# Altium footprint library agh_racing_2018.PcbLib: 174 footprints (part 10 of 11)
Each footprint in its own frame and in the unit in brackets; x right, y up, seen from the top. Pads: shape width x height; smd on the part's side, far side on the other; paste and mask are expansions set on the pad; w line width, h text height; cw(c..) or ccw(c..) is an arc to the next point about the centre after c.
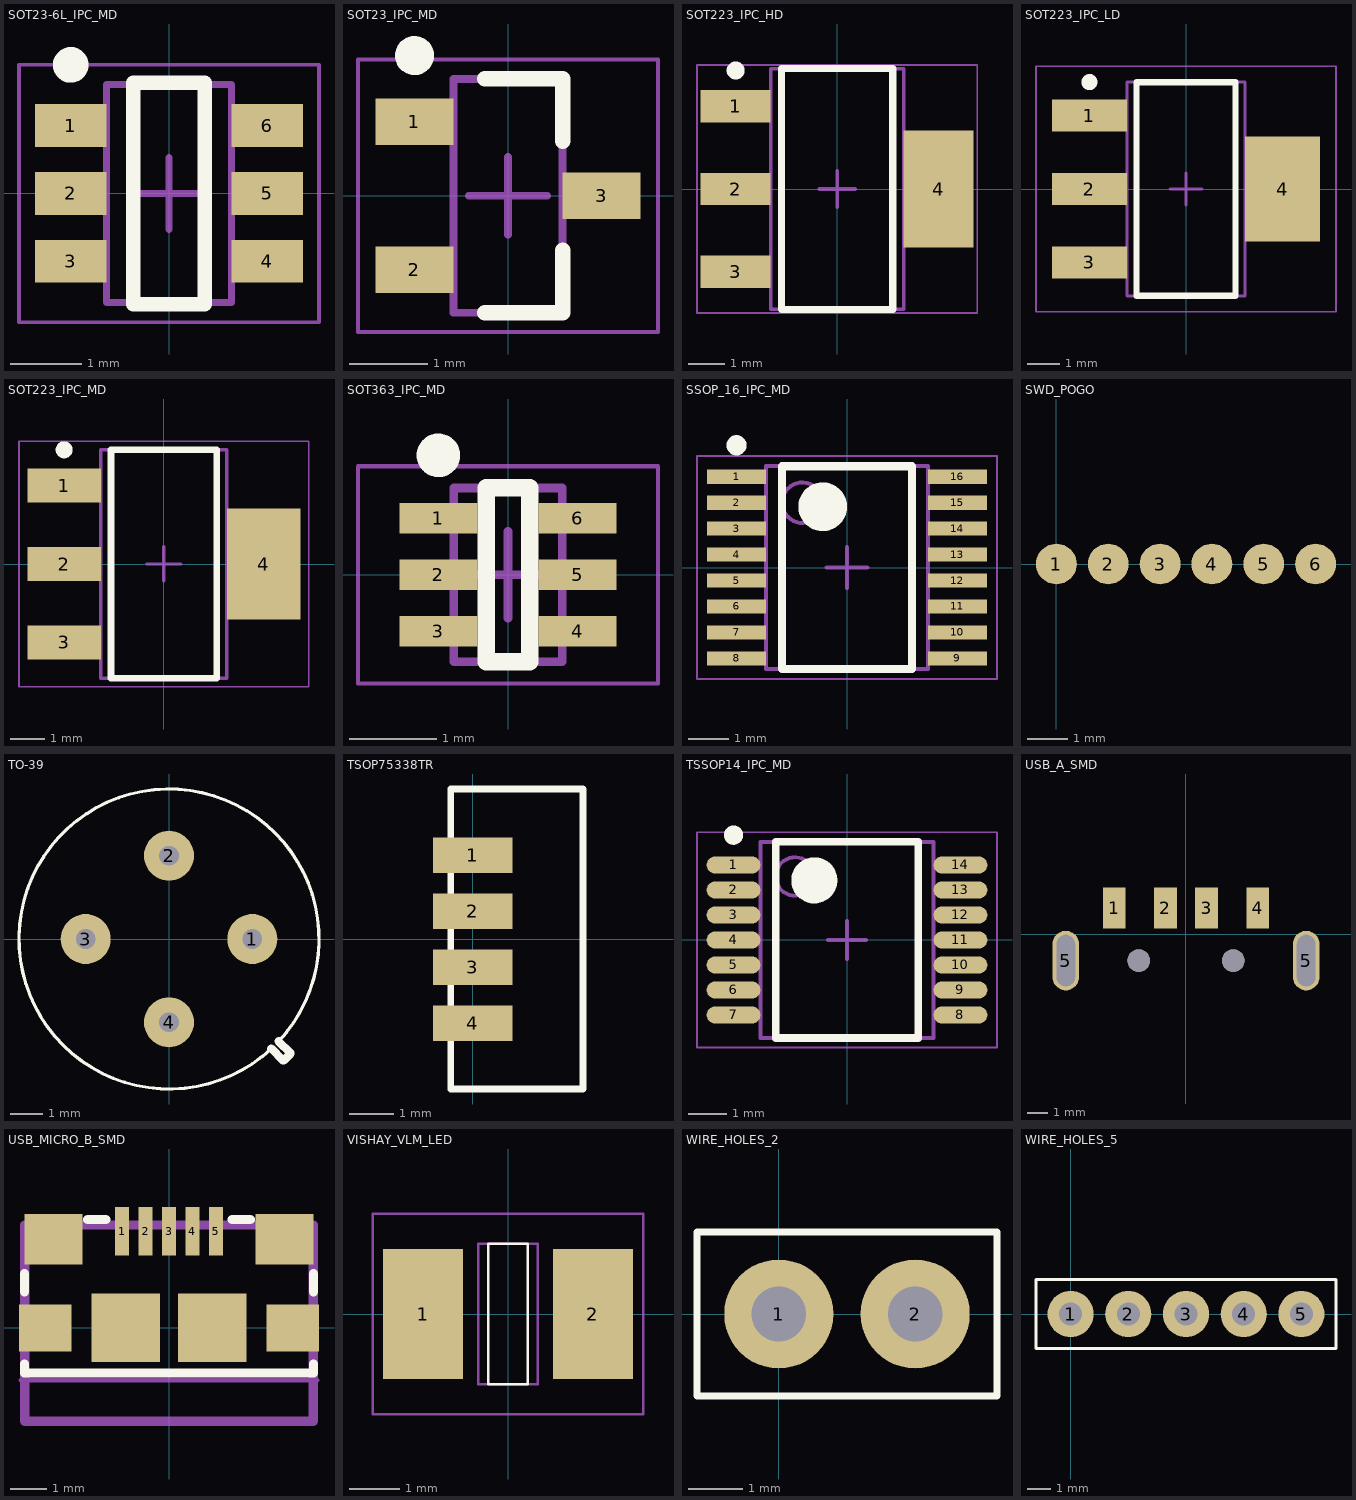
[diagram p9: the footprints below, top view; thin cyan lines are the x and y axes]

## SOT23-6L_IPC_MD [mm]
height 1.45
pads (6):
  rect 1x0.6 smd: 1(-1.375,0.95) 2(-1.375,0) 3(-1.375,-0.95) 4(1.375,-0.95) 5(1.375,0) 6(1.375,0.95)
Top Overlay:
  circle w0.25: c-1.375,1.8 r0.125
  lines w0.2: -0.5,-1.55 0.5,-1.55 0.5,1.55 -0.5,1.55 -0.5,-1.55
Assembly Top:
  lines w0.1: -0.875,-1.525 -0.875,1.525 0.875,1.525 0.875,-1.525 -0.875,-1.525
Courtyard Top:
  lines w0.05: -2.1,-1.8 -2.1,1.8 2.1,1.8 2.1,-1.8 -2.1,-1.8
  lines w0.1: -0.5,0 0.5,0 ; 0,-0.5 0,0.5
3D body "SOT23127P600-8N.step": height 1.45, standoff 0, extent -1.5,-1.525 1.5,1.525

## SOT23_IPC_MD [mm] "SOT23, 3-Leads, Body 2.90x2.45mm, Pitch 0.95mm, IPC Medium Density"
height 1.1
pads (3):
  rect 1x0.6 smd: 1(-1.2,0.95) 2(-1.2,-0.95) 3(1.2,0)
Top Overlay:
  circle w0.25: c-1.2,1.8 r0.125
  lines w0.2: -0.3,-1.5 0.7,-1.5 0.7,-0.7 ; -0.3,1.5 0.7,1.5 0.7,0.7
Mechanical 13:
  lines w0.1: -0.7,-1.5 0.7,-1.5 0.7,1.5 -0.7,1.5 -0.7,-1.5
Mechanical 15:
  lines w0.05: -1.925,-1.75 1.925,-1.75 1.925,1.75 -1.925,1.75 -1.925,-1.75
  lines w0.1: -0.5,0 0.5,0 ; 0,-0.5 0,0.5
3D body "SOT23_IPC_MD.step": height 1.1, standoff 0, extent -1.3,-1.5 1.3,1.5

## SOT223_IPC_HD [mm] "SOT223, 4-Leads, Body 6.50x7.00mm (avg), Pitch 2.30mm, IPC High Density"
height 1.8
pads (4):
  rect 1.95x0.9 smd: 1(-2.825,2.3) 2(-2.825,0) 3(-2.825,-2.3)
  rect 1.95x3.25 smd: 4(2.825,0)
Top Overlay:
  circle w0.25: c-2.825,3.3 r0.125
  lines w0.2: -1.55,-3.35 -1.55,3.35 1.55,3.35 1.55,-3.35 -1.55,-3.35
Mechanical 13:
  lines w0.1: -1.85,-3.35 -1.85,3.35 1.85,3.35 1.85,-3.35 -1.85,-3.35
Mechanical 15:
  lines w0.05: -3.9,-3.45 -3.9,3.45 3.9,3.45 3.9,-3.45 -3.9,-3.45
  lines w0.1: -0.5,0 0.5,0 ; 0,-0.5 0,0.5
3D body "SOT223_IPC_HD.step": height 1.8, standoff 0, extent -3.5,-3.35 3.5,3.35

## SOT223_IPC_LD [mm] "SOT223, 4-Leads, Body 6.50x7.00mm (avg), Pitch 2.30mm, IPC Low Density"
height 1.8
pads (4):
  rect 2.35x1 smd: 1(-3.025,2.3) 2(-3.025,0) 3(-3.025,-2.3)
  rect 2.35x3.3 smd: 4(3.025,0)
Top Overlay:
  circle w0.25: c-3.025,3.35 r0.125
  lines w0.2: -1.55,-3.35 -1.55,3.35 1.55,3.35 1.55,-3.35 -1.55,-3.35
Mechanical 13:
  lines w0.1: -1.85,-3.35 -1.85,3.35 1.85,3.35 1.85,-3.35 -1.85,-3.35
Mechanical 15:
  lines w0.05: -4.7,-3.85 -4.7,3.85 4.7,3.85 4.7,-3.85 -4.7,-3.85
  lines w0.1: -0.5,0 0.5,0 ; 0,-0.5 0,0.5
3D body "SOT223_IPC_LD.step": height 1.8, standoff 0, extent -3.5,-3.35 3.5,3.35

## SOT223_IPC_MD [mm] "SOT223, 4-Leads, Body 6.50x7.00mm (avg), Pitch 2.30mm, IPC Medium Density"
height 1.8
pads (4):
  rect 2.15x1 smd: 1(-2.925,2.3) 2(-2.925,0) 3(-2.925,-2.3)
  rect 2.15x3.25 smd: 4(2.925,0)
Top Overlay:
  circle w0.25: c-2.925,3.35 r0.125
  lines w0.2: -1.55,-3.35 -1.55,3.35 1.55,3.35 1.55,-3.35 -1.55,-3.35
Mechanical 13:
  lines w0.1: -1.85,-3.35 -1.85,3.35 1.85,3.35 1.85,-3.35 -1.85,-3.35
Mechanical 15:
  lines w0.05: -4.25,-3.6 -4.25,3.6 4.25,3.6 4.25,-3.6 -4.25,-3.6
  lines w0.1: -0.5,0 0.5,0 ; 0,-0.5 0,0.5
3D body "SOT223_IPC_MD.step": height 1.8, standoff 0, extent -3.5,-3.35 3.5,3.35

## SOT363_IPC_MD [mm] "SOT363, 6-Leads, Body, Pitch 0,65mm, IPC Medium Density"
height 0.9
pads (6):
  rect 0.9x0.35 smd: 1(-0.8,0.65) 2(-0.8,0) 3(-0.8,-0.65) 4(0.8,-0.65) 5(0.8,0) 6(0.8,0.65)
Top Overlay:
  circle w0.25: c-0.8,1.375 r0.125
  lines w0.2: -0.25,-1 -0.25,1 0.25,1 0.25,-1 -0.25,-1
Assembly Top:
  lines w0.1: -0.625,-1 0.625,-1 0.625,1 -0.625,1 -0.625,-1
Courtyard Top:
  lines w0.05: -1.725,-1.25 1.725,-1.25 1.725,1.25 -1.725,1.25 -1.725,-1.25
  lines w0.1: -0.5,0 0.5,0 ; 0,-0.5 0,0.5
3D body "SOT363_MD.step": height 0.9, standoff 0, extent -1.2,-1 1.2,1

## SSOP_16_IPC_MD [mm] "SSOP, 16-Leads, Pitch 0,64mm, IPC Medium Density"
height 1.75
pads (16):
  rect 1.45x0.35 smd mask+0.145: 1(-2.725,2.24) 2(-2.725,1.6) 3(-2.725,0.96) 4(-2.725,0.32) 5(-2.725,-0.32) 6(-2.725,-0.96) 7(-2.725,-1.6) 8(-2.725,-2.24) 9(2.725,-2.24) 10(2.725,-1.6) 11(2.725,-0.96) 12(2.725,-0.32) 13(2.725,0.32) 14(2.725,0.96) 15(2.725,1.6) 16(2.725,2.24)
Top Overlay:
  circle w0.25: c-2.725,3.015 r0.125
  circle w0.6: c-0.6,1.5 r0.3
  lines w0.2: -1.6,-2.5 -1.6,2.5 1.6,2.5 1.6,-2.5 -1.6,-2.5
Mechanical 13:
  circle w0.1: c-1.1,1.6 r0.5
  lines w0.1: -2,-2.5 -2,2.5 2,2.5 2,-2.5 -2,-2.5
Mechanical 15:
  lines w0.05: -3.7,-2.75 -3.7,2.75 3.7,2.75 3.7,-2.75 -3.7,-2.75
  lines w0.1: -0.5,0 0.5,0 ; 0,-0.5 0,0.5
3D body "SSOP16.step": height 1.75, standoff 0, extent -2.997,-2.5 2.997,2.5

## SWD_POGO [mm]
pads (6):
  round 1 smd mask+0.145: 1(0,0) 2(1.27,0) 3(2.54,0) 4(3.81,0) 5(5.08,0) 6(6.35,0)

## TO-39 [mil]
height 216.93
pads (4):
  round 60 hole 23.62: 1(100,0) 2(0,100) 3(-100,0) 4(0,-100)
Top Overlay:
  lines w3.94: 122.84,-131.73 cw(c0,0) 131.73,-122.84
  lines w10: 122.84,-131.73 136.78,-145.67 ; 131.73,-122.84 145.67,-136.78 145.67,-137.8 137.8,-145.67 ; 136.78,-145.67 137.8,-145.67 ; 136.78,-145.67 137.8,-145.67
3D body "EL-18009-AA Sensor.STEP": height 190.94, standoff -118.11, extent -183.07,-183.07 183.08,183.08

## TSOP75338TR [mm]
pads (4):
  rect 1.8x0.8 smd: 1(0,1.905) 2(0,0.635) 3(0,-0.635) 4(0,-1.905)
Top Overlay:
  lines w0.152: -0.5,-3.395 -0.5,3.405 2.5,3.405 2.5,-3.395 -0.5,-3.395
3D body "TSOP753.STEP": height 3, standoff 0, extent -0.507,-3.5 2.6,3.3

## TSSOP14_IPC_MD [mm] "TSSOP, 14-Leads, Body 5,00x4,40mm, Pitch 0,65mm, IPC Medium Density"
height 1.2
pads (14):
  oval 1.4x0.45 smd: 1(-2.95,1.95) 2(-2.95,1.3) 3(-2.95,0.65) 4(-2.95,0) 5(-2.95,-0.65) 6(-2.95,-1.3) 7(-2.95,-1.95) 8(2.95,-1.95) 9(2.95,-1.3) 10(2.95,-0.65) 11(2.95,0) 12(2.95,0.65) 13(2.95,1.3) 14(2.95,1.95)
Top Overlay:
  circle w0.6: c-0.85,1.55 r0.3
  circle w0.25: c-2.95,2.725 r0.125
  lines w0.2: -1.85,-2.55 1.85,-2.55 1.85,2.55 -1.85,2.55 -1.85,-2.55
Mechanical 13:
  circle w0.1: c-1.35,1.65 r0.5
  lines w0.1: -2.25,-2.55 2.25,-2.55 2.25,2.55 -2.25,2.55 -2.25,-2.55
Mechanical 15:
  lines w0.05: -3.9,-2.8 3.9,-2.8 3.9,2.8 -3.9,2.8 -3.9,-2.8
  lines w0.1: -0.5,0 0.5,0 ; 0,-0.5 0,0.5
3D body "TSSOP14_IPC_MD.step": height 1.2, standoff 0, extent -3.2,-2.55 3.2,2.55

## USB_A_SMD [mm]
pads (8):
  rect 1.1x2 smd: 1(-3.5,1.275) 2(-1,1.275) 3(1,1.275) 4(3.5,1.275)
  oval 1.3x2.9 hole 0.9 slot 2.5 at 90 deg: 5(-5.85,-1.275) 5(5.85,-1.275)
  round 1.1 hole 1.1: ""(-2.3,-1.275) ""(2.3,-1.275)
3D body "USB Series A Plug V2.stp": height 3.15, standoff -3.05, extent -6.5,-18.925 6.5,2.275

## USB_MICRO_B_SMD [mm]
pads (11):
  rect 0.4x1.35 smd: 1(-1.3,2.675) 2(-0.65,2.675) 3(0,2.675) 4(0.65,2.675) 5(1.3,2.675)
  rect 1.45x1.3 smd: ""(-3.425,0) ""(3.425,0)
  rect 1.6x1.4 smd: ""(-3.2,2.45) ""(3.2,2.45)
  rect 1.9x1.9 smd: ""(-1.2,0) ""(1.2,0)
Top Overlay:
  lines w0.254: -4,-1 -4,-1.25 4,-1.25 4,-1 ; -4,1 -4,1.5 ; -2.25,3 -1.75,3 ; 1.75,3 2.25,3 ; 4,1 4,1.5
Mechanical 1:
  lines w0.127: -4.1,-1.45 4.1,-1.45
Mechanical 13:
  lines w0.254: -3.99,-2.581 -3.99,2.85 3.991,2.85 3.991,-2.581 -3.99,-2.581
3D body "molex_0473460001.STEP": height 2.73, standoff -0.04, extent -3.99,-2.581 3.991,2.85

## VISHAY_VLM_LED [mm] "LED; SMD; 3528,PLCC2; zielony; 7,1-28mcd; 3,5x2,8x1,75mm; 120°"
height 2
pads (2):
  rect 1.6x2.6 smd: 1(-1.7,0) 2(1.7,0)
Top Overlay:
  lines w0.05: -0.4,-1.4 -0.4,1.4 0.4,1.4 0.4,-1.4 -0.4,-1.4
Mechanical 13:
  lines w0.05: -0.6,-1.4 -0.6,1.4 0.6,1.4 0.6,-1.4 -0.6,-1.4
Mechanical 15:
  lines w0.05: -2.7,-2 -2.7,2 2.7,2 2.7,-2 -2.7,-2
3D body "LED.STEP": height 1.75, standoff 0, extent -1.78,-1.4 1.78,1.4

## WIRE_HOLES_2 [mm] "Wire Holes, 2-pin"
pads (2):
  round 2 hole 1: 1(0,0) 2(2.5,0)
Top Overlay:
  lines w0.127: -1.5,-1.5 -1.5,1.5 4,1.5 4,-1.5 -1.5,-1.5

## WIRE_HOLES_5 [mm] "Wire Holes, 5-pin"
pads (5):
  round 2 hole 1: 1(0,0) 2(2.5,0) 3(5,0) 4(7.5,0) 5(10,0)
Top Overlay:
  lines w0.127: -1.5,-1.5 -1.5,1.5 11.5,1.5 11.5,-1.5 -1.5,-1.5